# Altium footprint library LTEWlib.PcbLib: 125 footprints (part 1 of 8)
Each footprint in its own frame and in the unit in brackets; x right, y up, seen from the top. Pads: shape width x height; smd on the part's side, far side on the other; paste and mask are expansions set on the pad; w line width, h text height; cw(c..) or ccw(c..) is an arc to the next point about the centre after c.
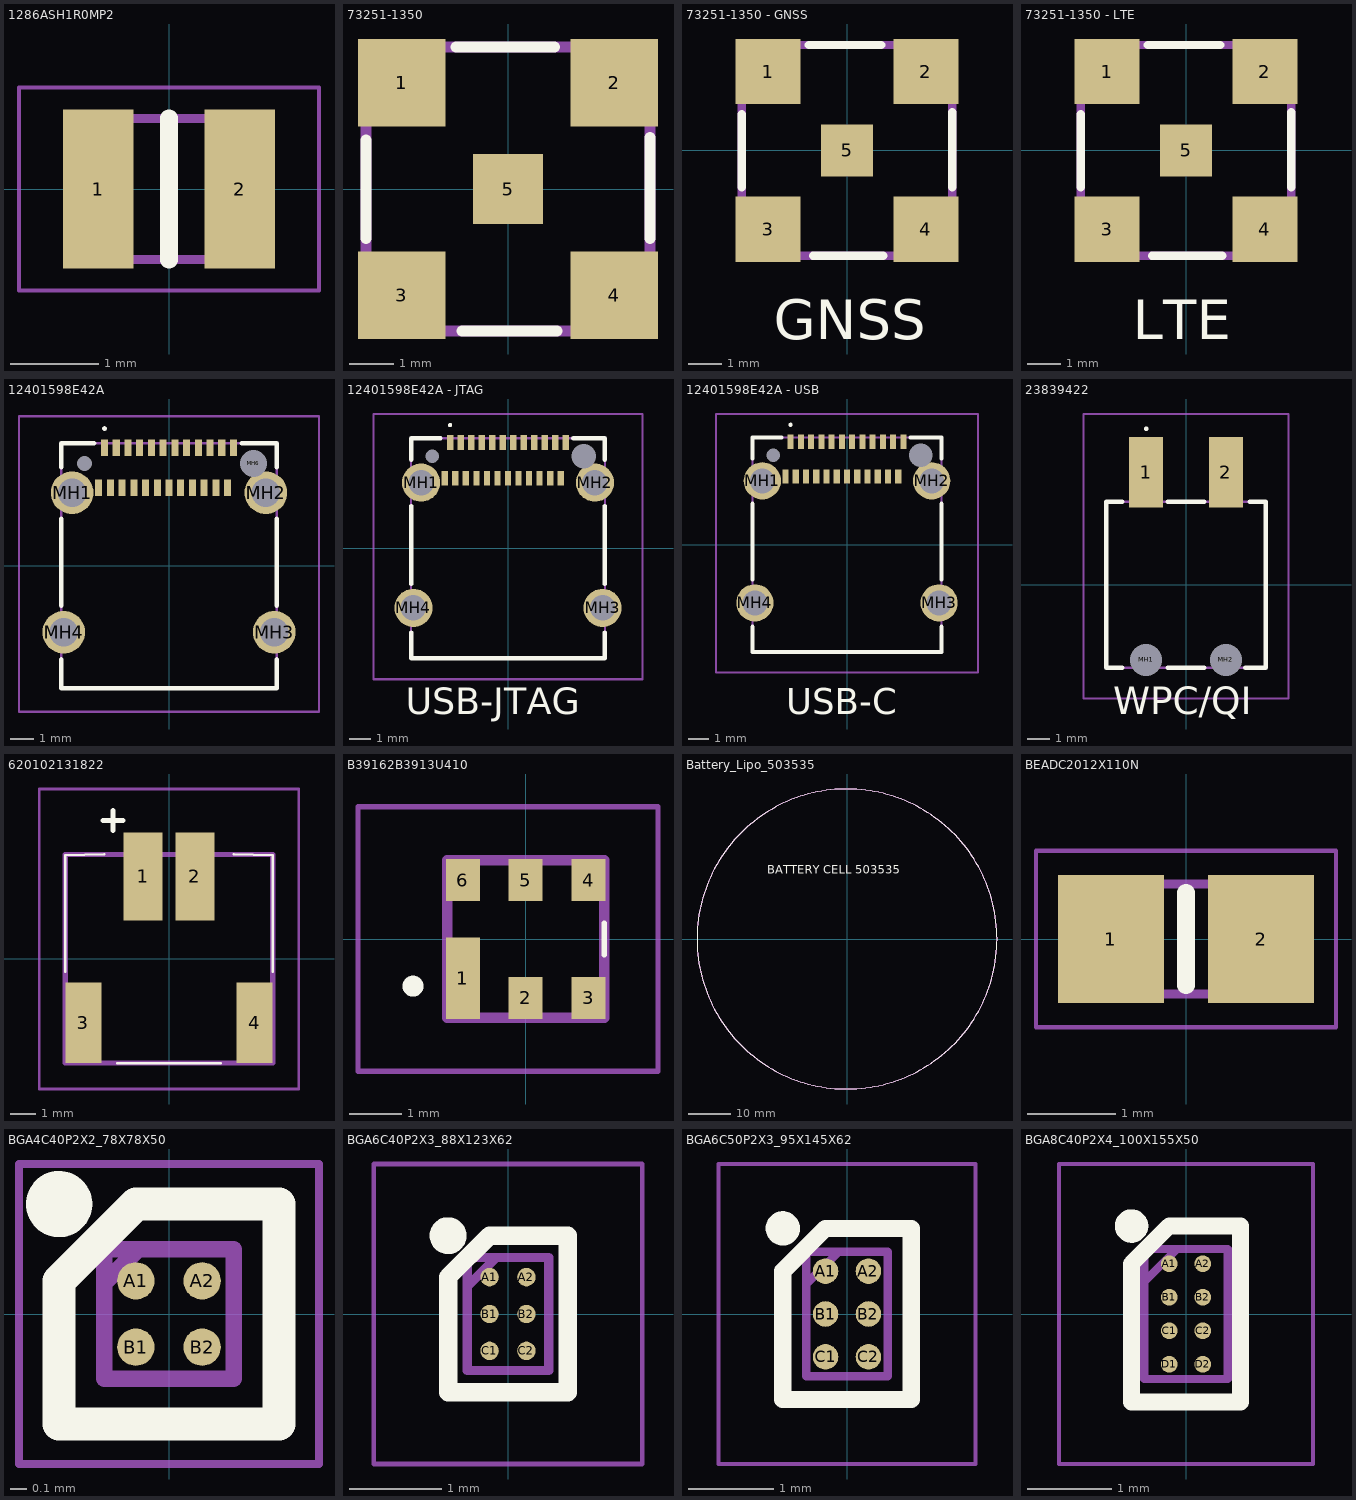
[diagram p0: the footprints below, top view; thin cyan lines are the x and y axes]

## 1286ASH1R0MP2 [mm]
pads (2):
  rect 0.8x1.8 smd: 1(-0.8,0) 2(0.8,0)
Top Overlay:
  lines w0.2: 0,-0.8 0,0.8
Mechanical 13:
  lines w0.1: -1,-0.8 1,-0.8 1,0.8 -1,0.8 -1,-0.8
Mechanical 15:
  lines w0.05: -1.7,-1.15 1.7,-1.15 1.7,1.15 -1.7,1.15 -1.7,-1.15
3D body "DFE201612E-1R0M=P2.stp": height 1.2, standoff 0, extent -1,-0.8 1,0.8

## 73251-1350 [mm]
pads (5):
  rect 1.96x1.96 smd: 1(-2.375,2.375) 2(2.375,2.375) 3(-2.375,-2.375) 4(2.375,-2.375)
  rect 1.57x1.57 smd: 5(0,0)
Top Overlay:
  lines w0.254: -3.175,-1.106 -3.175,1.087 ; -1.157,3.175 1.036,3.175 ; -1.024,-3.175 1.095,-3.175 ; 3.175,-1.106 3.175,1.146
Mechanical 13:
  lines w0.254: -3.175,-3.175 3.175,-3.175 3.175,3.175 -3.175,3.175 -3.175,-3.175
3D body "73251-1352.stp": height 9.53, standoff 0, extent -3.175,-3.175 3.175,3.175

## 73251-1350 - GNSS [mm]
pads (5):
  rect 1.96x1.96 smd: 1(-2.375,2.375) 2(2.375,2.375) 3(-2.375,-2.375) 4(2.375,-2.375)
  rect 1.57x1.57 smd: 5(0,0)
Top Overlay:
  lines w0.254: -3.175,-1.106 -3.175,1.087 ; -1.157,3.175 1.036,3.175 ; -1.024,-3.175 1.095,-3.175 ; 3.175,-1.106 3.175,1.146
  text "GNSS" at -2.199,-5.68 h1.2
Mechanical 13:
  lines w0.254: -3.175,-3.175 3.175,-3.175 3.175,3.175 -3.175,3.175 -3.175,-3.175
3D body "73251-1352.stp": height 9.53, standoff 0, extent -3.175,-3.175 3.175,3.175

## 73251-1350 - LTE [mm]
pads (5):
  rect 1.96x1.96 smd: 1(-2.375,2.375) 2(2.375,2.375) 3(-2.375,-2.375) 4(2.375,-2.375)
  rect 1.57x1.57 smd: 5(0,0)
Top Overlay:
  lines w0.254: -3.175,-1.106 -3.175,1.087 ; -1.157,3.175 1.036,3.175 ; -1.024,-3.175 1.095,-3.175 ; 3.175,-1.106 3.175,1.146
  text "LTE" at -1.599,-5.68 h1.2
Mechanical 13:
  lines w0.254: -3.175,-3.175 -3.175,3.175 3.175,3.175 3.175,-3.175 -3.175,-3.175
3D body "73251-1352.stp": height 9.53, standoff 0, extent -3.175,-3.175 3.175,3.175

## 12401598E42A [mm]
pads (30):
  rect 0.3x0.7 smd: A1(-2.75,5.025) A2(-2.25,5.025) A3(-1.75,5.025) A4(-1.25,5.025) A5(-0.75,5.025) A6(-0.25,5.025) A7(0.25,5.025) A8(0.75,5.025) A9(1.25,5.025) A10(1.75,5.025) A11(2.25,5.025) A12(2.75,5.025) B1(2.5,3.325) B2(2,3.325) B3(1.5,3.325) B4(1,3.325) B5(0.5,3.325) B6(0,3.325) B7(-0.5,3.325) B8(-1,3.325) B9(-1.5,3.325) B10(-2,3.325) B11(-2.5,3.325) B12(-3,3.325)
  round 1.815 hole 1.21: MH1(-4.13,3.115) MH2(4.13,3.115) MH3(4.49,-2.835) MH4(-4.49,-2.835)
  round 0.325 hole 0.65 unplated: MH5(-3.6,4.365)
  round 0.575 hole 1.15 unplated: MH6(3.6,4.365)
Top Overlay:
  lines w0.1: -2.751,5.8 cw(c-2.751,5.85) -2.751,5.9 ; -2.75,5.8 ccw(c-2.75,5.85) -2.75,5.9
  lines w0.2: -4.6,-4 -4.6,-5.225 4.6,-5.225 4.6,-4 ; -4.6,-1.7 -4.6,2 ; -4.6,4.2 -4.6,5.225 -3.2,5.225 ; 3.1,5.225 4.6,5.225 4.6,4.2 ; 4.6,-1.7 4.6,2
Mechanical 13:
  lines w0.1: -4.6,-5.225 4.6,-5.225 4.6,5.225 -4.6,5.225 -4.6,-5.225
Mechanical 15:
  lines w0.1: -6.397,-6.225 6.397,-6.225 6.397,6.375 -6.397,6.375 -6.397,-6.225
3D body "12401598E4#2A.stp": height 1.71, standoff -3.68, extent -4.582,-5.307 4.618,5.183

## 12401598E42A - JTAG [mm]
pads (30):
  rect 0.3x0.7 smd: A1(-2.75,5.025) A2(-2.25,5.025) A3(-1.75,5.025) A4(-1.25,5.025) A5(-0.75,5.025) A6(-0.25,5.025) A7(0.25,5.025) A8(0.75,5.025) A9(1.25,5.025) A10(1.75,5.025) A11(2.25,5.025) A12(2.75,5.025) B1(2.5,3.325) B2(2,3.325) B3(1.5,3.325) B4(1,3.325) B5(0.5,3.325) B6(0,3.325) B7(-0.5,3.325) B8(-1,3.325) B9(-1.5,3.325) B10(-2,3.325) B11(-2.5,3.325) B12(-3,3.325)
  round 1.815 hole 1.21: MH1(-4.13,3.115) MH2(4.13,3.115) MH3(4.49,-2.835) MH4(-4.49,-2.835)
  round 0.325 hole 0.65 unplated: MH5(-3.6,4.365)
  round 0.575 hole 1.15 unplated: MH6(3.6,4.365)
Top Overlay:
  lines w0.1: -2.751,5.8 cw(c-2.751,5.85) -2.751,5.9 ; -2.75,5.8 ccw(c-2.75,5.85) -2.75,5.9
  lines w0.2: -4.6,-4 -4.6,-5.225 4.6,-5.225 4.6,-4 ; -4.6,-1.7 -4.6,2 ; -4.6,4.2 -4.6,5.225 -3.2,5.225 ; 3.1,5.225 4.6,5.225 4.6,4.2 ; 4.6,-1.7 4.6,2
  text "USB-JTAG" at -4.867,-7.874 h1.27
Mechanical 13:
  lines w0.1: -4.6,-5.225 -4.6,5.225 4.6,5.225 4.6,-5.225 -4.6,-5.225
Mechanical 15:
  lines w0.1: -6.397,-6.225 -6.397,6.375 6.397,6.375 6.397,-6.225 -6.397,-6.225
3D body "12401598E4#2A.stp": height 1.71, standoff -3.68, extent -4.582,-5.307 4.618,5.183

## 12401598E42A - USB [mm]
pads (30):
  rect 0.3x0.7 smd: A1(-2.75,5.025) A2(-2.25,5.025) A3(-1.75,5.025) A4(-1.25,5.025) A5(-0.75,5.025) A6(-0.25,5.025) A7(0.25,5.025) A8(0.75,5.025) A9(1.25,5.025) A10(1.75,5.025) A11(2.25,5.025) A12(2.75,5.025) B1(2.5,3.325) B2(2,3.325) B3(1.5,3.325) B4(1,3.325) B5(0.5,3.325) B6(0,3.325) B7(-0.5,3.325) B8(-1,3.325) B9(-1.5,3.325) B10(-2,3.325) B11(-2.5,3.325) B12(-3,3.325)
  round 1.815 hole 1.21: MH1(-4.13,3.115) MH2(4.13,3.115) MH3(4.49,-2.835) MH4(-4.49,-2.835)
  round 0.325 hole 0.65 unplated: MH5(-3.6,4.365)
  round 0.575 hole 1.15 unplated: MH6(3.6,4.365)
Top Overlay:
  lines w0.1: -2.751,5.8 cw(c-2.751,5.85) -2.751,5.9 ; -2.75,5.8 ccw(c-2.75,5.85) -2.75,5.9
  lines w0.2: -4.6,-4 -4.6,-5.225 4.6,-5.225 4.6,-4 ; -4.6,-1.7 -4.6,2 ; -4.6,4.2 -4.6,5.225 -3.2,5.225 ; 3.1,5.225 4.6,5.225 4.6,4.2 ; 4.6,-1.7 4.6,2
  text "USB-C" at -2.962,-8.255 h1.27
Mechanical 13:
  lines w0.1: -4.6,-5.225 4.6,-5.225 4.6,5.225 -4.6,5.225 -4.6,-5.225
Mechanical 15:
  lines w0.1: -6.397,-6.225 6.397,-6.225 6.397,6.375 -6.397,6.375 -6.397,-6.225
3D body "12401598E4#2A.stp": height 1.71, standoff -3.68, extent -4.582,-5.307 4.618,5.183

## 23839422 [mm]
pads (4):
  rect 1.5x3.1 smd: 1(-1.75,4.95) 2(1.75,4.95)
  round 0.7 hole 1.4 unplated: MH1(-1.75,-3.3) MH2(1.75,-3.3)
Top Overlay:
  lines w0.1: -1.75,6.8 ccw(c-1.75,6.85) -1.75,6.9 ccw(c-1.75,6.85) -1.75,6.8
  lines w0.2: -2.8,-3.65 -3.5,-3.65 -3.5,3.65 -2.8,3.65 ; -0.8,-3.65 0.8,-3.65 ; -0.8,3.65 0.8,3.65 ; 2.6,-3.65 3.5,-3.65 3.5,3.65 2.8,3.65
  text "WPC/QI" at -3.199,-5.68 h1.2
Mechanical 13:
  lines w0.1: -3.5,-3.65 3.5,-3.65 3.5,3.65 -3.5,3.65 -3.5,-3.65
Mechanical 15:
  lines w0.1: -4.5,-5 4.5,-5 4.5,7.5 -4.5,7.5 -4.5,-5
3D body "2383942-2.stp": height 8.75, standoff -1.7, extent -3.5,-3.899 3.5,6.35

## 620102131822 [mm]
pads (4):
  rect 1.5x3.4 smd: 1(-1,3.175) 2(1,3.175)
  rect 1.4x3.1 smd: 3(-3.3,-2.475) 4(3.3,-2.475)
Top Overlay:
  lines w0.1: -4,-0.5 -4,4 -2.5,4.025 ; -2,-4.025 2,-4.025 ; 2.5,4.025 4,4 4,-0.5
  lines w0.2: -2.54,5.334 -2.159,5.334 ; -2.159,4.953 -2.159,5.334 ; -2.159,5.715 -2.159,5.334 ; -1.778,5.334 -2.159,5.334
Mechanical 13:
  lines w0.2: -4,-4.025 4,-4.025 4,4.025 -4,4.025 -4,-4.025
Mechanical 15:
  lines w0.1: -5,-5.025 5,-5.025 5,6.55 -5,6.55 -5,-5.025
3D body "620102131822.stp": height 5.9, standoff 0, extent -4,-4.025 4,4.725

## B39162B3913U410 [mm]
pads (6):
  rect 0.65x1.55 smd: 1(-1.2,-0.75)
  rect 0.65x0.8 smd: 2(0,-1.125) 3(1.2,-1.125) 4(1.2,1.125) 5(0,1.125) 6(-1.2,1.125)
Top Overlay:
  lines w0.1: 1.5,-0.3 1.5,0.3
  lines w0.3: -2.2,-0.9 ccw(c-2.15,-0.9) -2.1,-0.9 ccw(c-2.15,-0.9) -2.2,-0.9
Mechanical 13:
  lines w0.2: -1.5,-1.5 -1.5,1.5 1.5,1.5 1.5,-1.5 -1.5,-1.5
Mechanical 15:
  lines w0.1: -3.2,-2.525 -3.2,2.525 2.525,2.525 2.525,-2.525 -3.2,-2.525
3D body "B39162B3913U410.stp": height 1.33, standoff 0, extent -1.5,-1.5 1.5,1.5

## Battery_Lipo_503535 [mm] "580mAh"
Top Overlay:
  circle w0.254: c0,0 r35
  text "BATTERY CELL 503535" at -18.661,15.254 h2
Keep-Out Layer:
  circle w0.254: c0,0 r35
Mechanical 13:
  circle w0.254: c0,0 r35
3D body: height 3, standoff 0, extent -35,-35 35,35

## BEADC2012X110N [mm]
pads (2):
  rect 1.2x1.45 smd: 1(-0.85,0) 2(0.85,0)
Top Overlay:
  lines w0.2: 0,-0.525 0,0.525
Mechanical 13:
  lines w0.1: -1,-0.625 1,-0.625 1,0.625 -1,0.625 -1,-0.625
Mechanical 15:
  lines w0.05: -1.7,-1 1.7,-1 1.7,1 -1.7,1 -1.7,-1
3D body "HZ0805E601R-10.stp": height 1.1, standoff 0, extent -1,-0.625 1,0.625

## BGA4C40P2X2_78X78X50 [mm]
pads (4):
  round 0.226 smd: A1(-0.2,0.2) A2(0.2,0.2) B1(-0.2,-0.2) B2(0.2,-0.2)
Top Overlay:
  circle w0.2: c-0.663,0.663 r0.1
  lines w0.2: -0.663,-0.663 0.663,-0.663 0.663,0.663 -0.2,0.663 -0.663,0.2 -0.663,-0.663
Mechanical 13:
  lines w0.1: -0.39,0.188 -0.188,0.39 ; -0.39,-0.39 0.39,-0.39 0.39,0.39 -0.39,0.39 -0.39,-0.39
Mechanical 15:
  lines w0.05: -0.905,-0.905 0.905,-0.905 0.905,0.905 -0.905,0.905 -0.905,-0.905
3D body "TPS22916CNYFPT.stp": height 0.5, standoff 0, extent -0.39,-0.39 0.39,0.39

## BGA6C40P2X3_88X123X62 [mm]
pads (6):
  round 0.2 smd: A1(-0.2,0.4) A2(0.2,0.4) B1(-0.2,0) B2(0.2,0) C1(-0.2,-0.4) C2(0.2,-0.4)
Top Overlay:
  circle w0.2: c-0.65,0.85 r0.1
  lines w0.2: -0.65,-0.85 0.65,-0.85 0.65,0.85 -0.2,0.85 -0.65,0.4 -0.65,-0.85
Mechanical 13:
  lines w0.1: -0.442,0.299 -0.128,0.613 ; -0.442,-0.613 0.442,-0.613 0.442,0.613 -0.442,0.613 -0.442,-0.613
Mechanical 15:
  lines w0.05: -1.457,-1.628 1.457,-1.628 1.457,1.628 -1.457,1.628 -1.457,-1.628
3D body "TPS610992YFFR.stp": height 0.63, standoff 0, extent -0.442,-0.613 0.442,0.613

## BGA6C50P2X3_95X145X62 [mm]
pads (6):
  round 0.298 smd: A1(-0.25,0.5) A2(0.25,0.5) B1(-0.25,0) B2(0.25,0) C1(-0.25,-0.5) C2(0.25,-0.5)
Top Overlay:
  circle w0.2: c-0.749,0.999 r0.1
  lines w0.2: -0.749,-0.999 0.749,-0.999 0.749,0.999 -0.25,0.999 -0.749,0.5 -0.749,-0.999
Mechanical 13:
  lines w0.1: -0.475,0.35 -0.1,0.725 ; -0.475,-0.725 0.475,-0.725 0.475,0.725 -0.475,0.725 -0.475,-0.725
Mechanical 15:
  lines w0.05: -1.5,-1.75 1.5,-1.75 1.5,1.75 -1.5,1.75 -1.5,-1.75
3D body "CSD75208W1015.stp": height 0.63, standoff 0, extent -0.475,-0.725 0.475,0.725

## BGA8C40P2X4_100X155X50 [mm]
pads (8):
  round 0.2 smd: A1(-0.2,0.6) A2(0.2,0.6) B1(-0.2,0.2) B2(0.2,0.2) C1(-0.2,-0.2) C2(0.2,-0.2) D1(-0.2,-0.6) D2(0.2,-0.6)
Top Overlay:
  circle w0.2: c-0.65,1.05 r0.1
  lines w0.2: -0.65,-1.05 0.65,-1.05 0.65,1.05 -0.2,1.05 -0.65,0.6 -0.65,-1.05
Mechanical 13:
  lines w0.1: -0.5,0.38 -0.105,0.775 ; -0.5,-0.775 0.5,-0.775 0.5,0.775 -0.5,0.775 -0.5,-0.775
Mechanical 15:
  lines w0.05: -1.515,-1.79 1.515,-1.79 1.515,1.79 -1.515,1.79 -1.515,-1.79
3D body "BQ25180YBGR.stp": height 0.5, standoff 0, extent -0.5,-0.775 0.5,0.775